# Altium schematic symbol library IC.SchLib: 555 symbols (part 15 of 15)
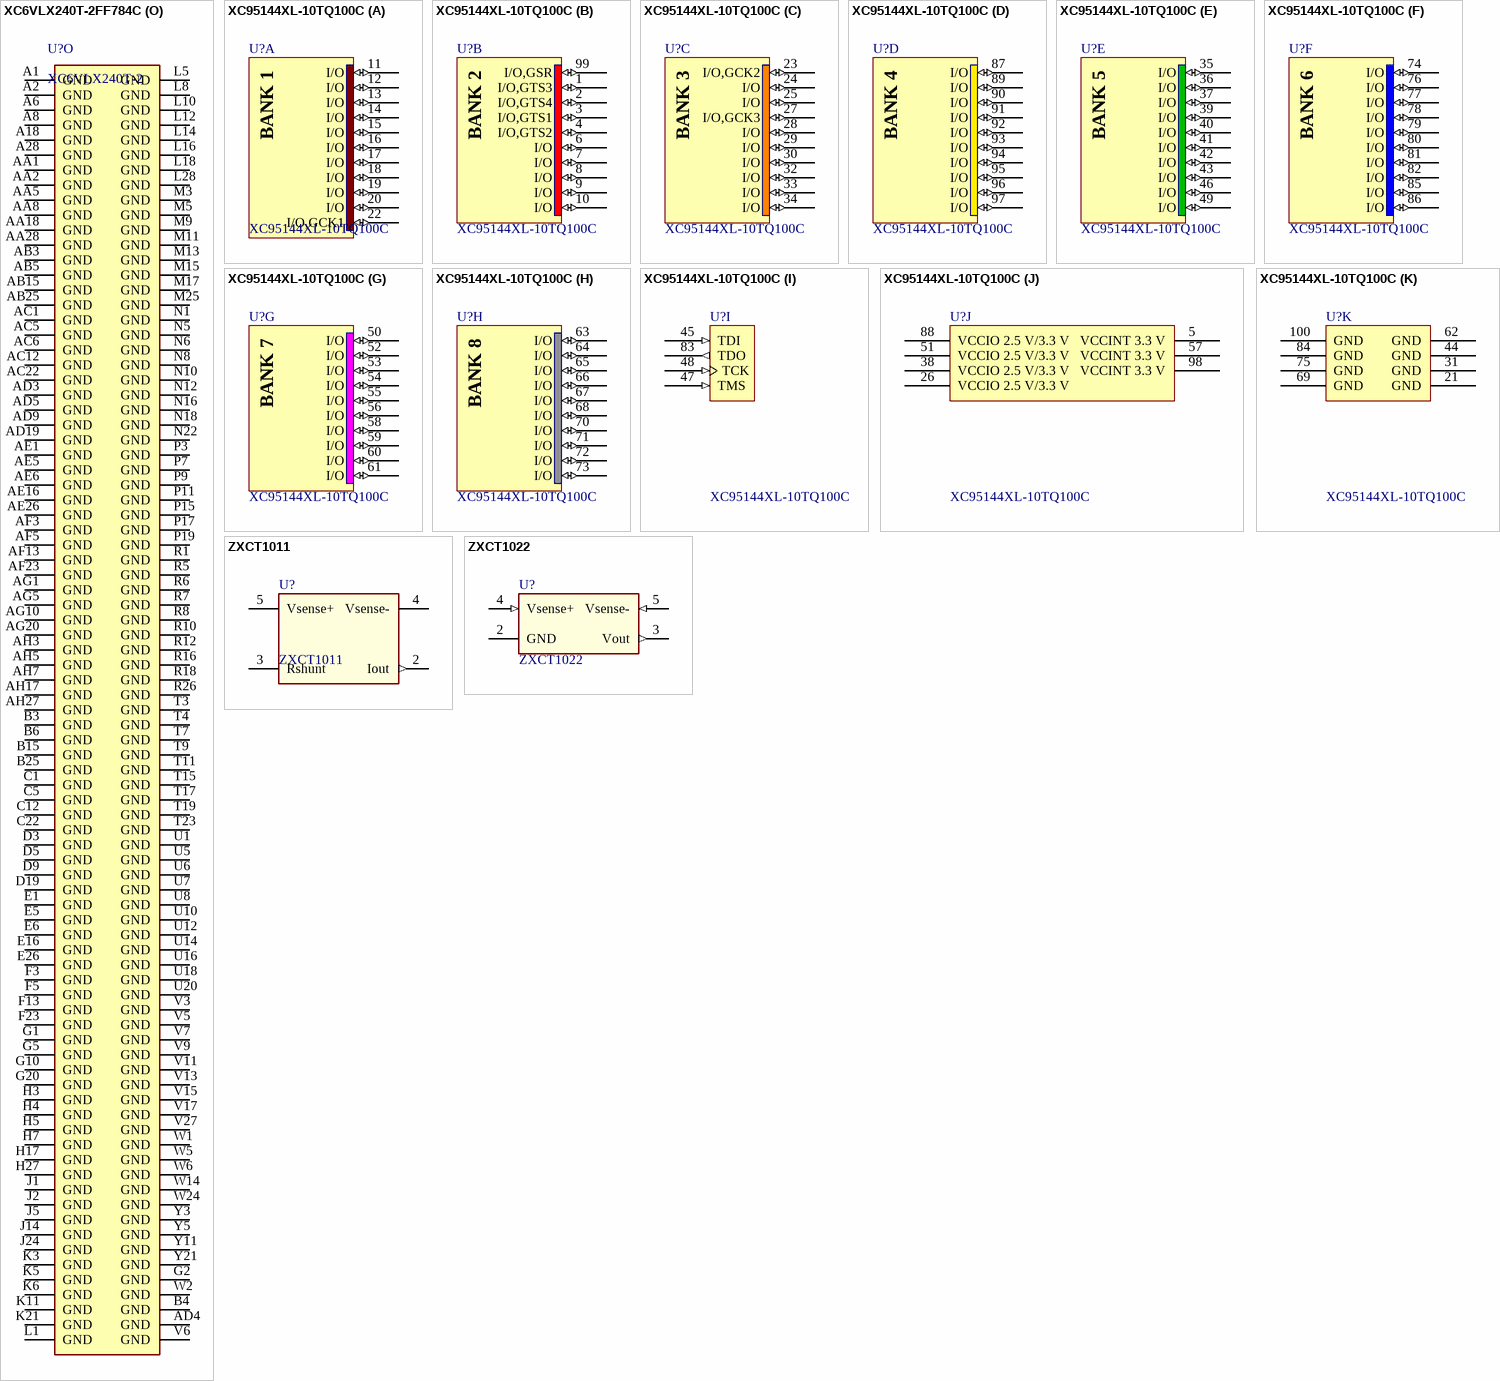
[diagram p84: symbols XC6VLX240T-2FF784C to ZXCT1022]

## XC6VLX240T-2FF784C
designator U?, comment XC6VLX240T-2
Xilinx Virtex-6 LXT Platform FPGA, 784-Ball FFBGA, Speed Grade 2, 400 User I/Os, 12 GTXs, Commercial Grade, Pb-Free; Manufacturer No: XC6VLX240T-2FF784C; Sort: 510; Tech: SMDR; Manufacturer: Xilinx; Package: FFG784; Price: 0
footprint FF784 (BGA, 784-Leads, Body 29x29mm, Pitch 1mm)
signal-integrity model XC6VLX75T_FF784 (Virtex-6)
part A pins: P20 IO_L14N_VREF_14 (io), P21 IO_L8P_SRCC_14 (io), P22 IO_L8N_SRCC_14 (io), R20 IO_L14P_14 (io), R21 VCCO_14 (power), R22 IO_L18P_14 (io), R23 IO_L18N_14 (io), R24 IO_L12P_VRN_14 (io), R25 IO_L12N_VRP_14 (io), R27 IO_L0P_14 (io), R28 IO_L0N_14 (io), T21 IO_L19P_14 (io), T22 IO_L19N_14 (io), T24 IO_L15P_14 (io), T25 IO_L15N_14 (io), T26 IO_L10N_MRCC_14 (io), T27 IO_L1P_14 (io), T28 VCCO_14 (power), U21 IO_L17N_14 (io), U22 IO_L17P_14 (io), U23 IO_L11N_SRCC_14 (io), U24 IO_L16N_14 (io), U25 VCCO_14 (power), U26 IO_L10P_MRCC_14 (io), U27 IO_L1N_14 (io), U28 IO_L2N_14 (io), V22 VCCO_14 (power), V23 IO_L11P_SRCC_14 (io), V24 IO_L16P_14 (io), V25 IO_L3N_14 (io), V26 IO_L4N_VREF_14 (io), V28 IO_L2P_14 (io), W22 IO_L13N_14 (io), W23 IO_L9N_MRCC_14 (io), W25 IO_L3P_14 (io), W26 IO_L4P_14 (io), W27 IO_L6P_14 (io), W28 IO_L5N_14 (io), Y22 IO_L13P_14 (io), Y23 IO_L9P_MRCC_14 (io), Y24 IO_L7N_14 (io), Y25 IO_L7P_14 (io), Y26 VCCO_14 (power), Y27 IO_L6N_14 (io), Y28 IO_L5P_14 (io)
part B pins: H25 IO_L1P_15 (io), H26 IO_L1N_15 (io), J23 IO_L2N_SM8N_15 (io), J25 IO_L5N_SM10N_15 (io), J26 IO_L3P_SM9P_15 (io), J27 IO_L3N_SM9N_15 (io), J28 IO_L7P_SM12P_15 (io), K22 IO_L0P_15 (io), K23 IO_L0N_15 (io), K24 IO_L2P_SM8P_15 (io), K25 IO_L5P_SM10P_15 (io), K26 VCCO_15 (power), K27 IO_L9P_MRCC_15 (io), K28 IO_L7N_SM12N_15 (io), L20 IO_L4P_15 (io), L21 IO_L8P_SRCC_15 (io), L22 IO_L8N_SRCC_15 (io), L23 VCCO_15 (power), L24 IO_L14P_15 (io), L25 IO_L14N_VREF_15 (io), L26 IO_L9N_MRCC_15 (io), L27 IO_L12N_SM13N_15 (io), M19 IO_L4N_VREF_15 (io), M20 VCCO_15 (power), M21 IO_L10N_MRCC_15 (io), M22 IO_L10P_MRCC_15 (io), M23 IO_L6P_SM11P_15 (io), M24 IO_L6N_SM11N_15 (io), M26 IO_L11P_SRCC_15 (io), M27 IO_L12P_SM13P_15 (io), M28 IO_L15N_SM15N_15 (io), N20 IO_L18P_15 (io), N21 IO_L18N_15 (io), N23 IO_L19P_15 (io), N24 IO_L16P_VRN_15 (io), N25 IO_L16N_VRP_15 (io), N26 IO_L11N_SRCC_15 (io), N27 VCCO_15 (power), N28 IO_L15P_SM15P_15 (io), P23 IO_L19N_15 (io), P24 VCCO_15 (power), P25 IO_L17N_15 (io), P26 IO_L17P_15 (io), P27 IO_L13N_SM14N_15 (io), P28 IO_L13P_SM14P_15 (io)
part C pins: A26 IO_L7P_16 (io), A27 IO_L7N_16 (io), B24 IO_L1P_16 (io), B26 IO_L3P_16 (io), B27 IO_L9P_MRCC_16 (io), B28 IO_L9N_MRCC_16 (io), C23 IO_L4N_VREF_16 (io), C24 IO_L1N_16 (io), C25 IO_L3N_16 (io), C26 IO_L18N_16 (io), C27 VCCO_16 (power), C28 IO_L11N_SRCC_16 (io), D22 IO_L4P_16 (io), D23 IO_L14N_VREF_16 (io), D24 VCCO_16 (power), D25 IO_L6N_16 (io), D26 IO_L18P_16 (io), D27 IO_L11P_SRCC_16 (io), D28 IO_L13P_16 (io), E22 IO_L5P_16 (io), E23 IO_L14P_16 (io), E24 IO_L6P_16 (io), E25 IO_L10P_MRCC_16 (io), E27 IO_L16N_16 (io), E28 IO_L13N_16 (io), F22 IO_L5N_16 (io), F24 IO_L10N_MRCC_16 (io), F25 IO_L15N_16 (io), F26 IO_L15P_16 (io), F27 IO_L16P_16 (io), F28 VCCO_16 (power), G22 IO_L0P_16 (io), G23 IO_L2N_16 (io), G24 IO_L12N_VRP_16 (io), G25 VCCO_16 (power), G26 IO_L17N_16 (io), G27 IO_L17P_16 (io), G28 IO_L19P_16 (io), H21 IO_L0N_16 (io), H22 VCCO_16 (power), H23 IO_L2P_16 (io), H24 IO_L12P_VRN_16 (io), H28 IO_L19N_16 (io), J21 IO_L8P_SRCC_16 (io), J22 IO_L8N_SRCC_16 (io)
part D pins: AA19 IO_L12P_VRN_23 (io), AA20 IO_L11N_SRCC_23 (io), AA21 IO_L5P_23 (io), AB18 IO_L16P_23 (io), AB19 IO_L15N_23 (io), AB20 VCCO_23 (power), AB21 IO_L5N_23 (io), AC18 IO_L16N_23 (io), AC19 IO_L15P_23 (io), AC20 IO_L9N_MRCC_23 (io), AC21 IO_L1N_23 (io), AD18 IO_L14P_23 (io), AD20 IO_L8P_SRCC_23 (io), AD21 IO_L9P_MRCC_23 (io), AD22 IO_L1P_23 (io), AE18 IO_L14N_VREF_23 (io), AE19 IO_L10N_MRCC_23 (io), AE20 IO_L8N_SRCC_23 (io), AE21 VCCO_23 (power), AE22 IO_L4N_VREF_23 (io), AF17 IO_L13N_23 (io), AF18 VCCO_23 (power), AF19 IO_L10P_MRCC_23 (io), AF20 IO_L7N_23 (io), AF21 IO_L3N_23 (io), AF22 IO_L4P_23 (io), AG17 IO_L13P_23 (io), AG18 IO_L18P_23 (io), AG19 IO_L19N_23 (io), AG21 IO_L7P_23 (io), AG22 IO_L3P_23 (io), AH18 IO_L18N_23 (io), AH19 IO_L19P_23 (io), AH20 IO_L17P_23 (io), AH21 IO_L17N_23 (io), AH22 VCCO_23 (power), V19 IO_L2N_23 (io), V20 IO_L2P_23 (io), V21 IO_L0N_23 (io), W18 IO_L6N_23 (io), W19 VCCO_23 (power), W21 IO_L0P_23 (io), Y18 IO_L6P_23 (io), Y19 IO_L12N_VRP_23 (io), Y20 IO_L11P_SRCC_23 (io)
part E pins: AA22 IO_L19N_24 (io), AA23 VCCO_24 (power), AA24 IO_L6P_D7_24 (io), AA25 IO_L6N_D6_24 (io), AA26 IO_L0P_GC_24 (io), AA27 IO_L0N_GC_24 (io), AB22 IO_L19P_24 (io), AB23 IO_L11P_SRCC_24 (io), AB24 IO_L16N_CSO_B_24 (io), AB26 IO_L8N_SRCC_24 (io), AB27 IO_L8P_SRCC_24 (io), AB28 IO_L2N_D14_24 (io), AC23 IO_L11N_SRCC_24 (io), AC24 IO_L16P_RS0_24 (io), AC25 IO_L7P_D5_24 (io), AC26 IO_L12P_D3_24 (io), AC27 VCCO_24 (power), AC28 IO_L2P_D15_24 (io), AD23 IO_L18N_24 (io), AD24 VCCO_24 (power), AD25 IO_L7N_D4_24 (io), AD26 IO_L12N_D2_FS2_24 (io), AD27 IO_L1N_GC_24 (io), AD28 IO_L1P_GC_24 (io), AE23 IO_L18P_24 (io), AE24 IO_L14P_FCS_B_24 (io), AE25 IO_L10P_MRCC_24 (io), AE27 IO_L5N_D8_24 (io), AE28 IO_L5P_D9_24 (io), AF24 IO_L14N_VREF_FOE_B_MOSI_24 (io), AF25 IO_L10N_MRCC_24 (io), AF26 IO_L9P_MRCC_24 (io), AF27 IO_L3N_D12_24 (io), AF28 VCCO_24 (power), AG23 IO_L17N_VRP_24 (io), AG24 IO_L15P_FWE_B_24 (io), AG25 VCCO_24 (power), AG26 IO_L9N_MRCC_24 (io), AG27 IO_L4P_D11_24 (io), AG28 IO_L3P_D13_24 (io), AH23 IO_L17P_VRN_24 (io), AH24 IO_L15N_RS1_24 (io), AH25 IO_L13N_D0_FS0_24 (io), AH26 IO_L13P_D1_FS1_24 (io), AH28 IO_L4N_VREF_D10_24 (io)
part F pins: A19 IO_L8N_SRCC_25 (io), A20 IO_L8P_SRCC_25 (io), A21 IO_L11P_SRCC_25 (io), A22 IO_L11N_SRCC_25 (io), A23 VCCO_25 (power), A24 IO_L15P_25 (io), A25 IO_L15N_25 (io), B18 IO_L5P_25 (io), B19 IO_L5N_25 (io), B20 VCCO_25 (power), B21 IO_L13P_25 (io), B22 IO_L17P_25 (io), B23 IO_L17N_25 (io), C18 IO_L3P_25 (io), C19 IO_L12P_25 (io), C20 IO_L12N_25 (io), C21 IO_L13N_25 (io), D17 IO_L6P_25 (io), D18 IO_L3N_25 (io), D20 IO_L10P_MRCC_25 (io), D21 IO_L16N_VRP_25 (io), E17 IO_L6N_25 (io), E18 IO_L7P_25 (io), E19 IO_L10N_MRCC_25 (io), E20 IO_L16P_VRN_25 (io), E21 VCCO_25 (power), F17 IO_L1N_25 (io), F18 VCCO_25 (power), F19 IO_L7N_25 (io), F20 IO_L19P_GC_25 (io), F21 IO_L19N_GC_25 (io), G17 IO_L1P_25 (io), G18 IO_L4P_25 (io), G19 IO_L9N_MRCC_25 (io), G21 IO_L18N_GC_25 (io), H18 IO_L4N_VREF_25 (io), H19 IO_L9P_MRCC_25 (io), H20 IO_L18P_GC_25 (io), J17 IO_L2P_25 (io), J18 IO_L2N_25 (io), J19 VCCO_25 (power), J20 IO_L14N_VREF_25 (io), K17 IO_L0P_25 (io), K18 IO_L0N_25 (io), K19 IO_L14P_25 (io)
part G pins: A11 IO_L14P_26 (io), A12 IO_L14N_VREF_26 (io), A13 VCCO_26 (power), A14 IO_L9N_MRCC_26 (io), A15 IO_L13P_26 (io), A16 IO_L13N_26 (io), A17 IO_L17P_26 (io), B11 IO_L5P_26 (io), B12 IO_L18P_26 (io), B13 IO_L7N_26 (io), B14 IO_L9P_MRCC_26 (io), B16 IO_L15N_26 (io), B17 IO_L17N_26 (io), C11 IO_L5N_26 (io), C13 IO_L18N_26 (io), C14 IO_L7P_26 (io), C15 IO_L15P_26 (io), C16 IO_L16N_26 (io), C17 VCCO_26 (power), D11 IO_L0N_26 (io), D12 IO_L6N_26 (io), D13 IO_L6P_26 (io), D14 VCCO_26 (power), D15 IO_L12N_VRP_26 (io), D16 IO_L16P_26 (io), E11 VCCO_26 (power), E12 IO_L0P_26 (io), E13 IO_L1P_26 (io), E14 IO_L1N_26 (io), E15 IO_L12P_VRN_26 (io), F12 IO_L11N_SRCC_26 (io), F14 IO_L3N_26 (io), F15 IO_L10N_MRCC_26 (io), F16 IO_L10P_MRCC_26 (io), G12 IO_L11P_SRCC_26 (io), G13 IO_L19N_26 (io), G14 IO_L3P_26 (io), G15 VCCO_26 (power), G16 IO_L2N_26 (io), H14 IO_L19P_26 (io), H15 IO_L4N_VREF_26 (io), H16 IO_L2P_26 (io), J15 IO_L8P_SRCC_26 (io), J16 IO_L4P_26 (io), K15 IO_L8N_SRCC_26 (io)
part H pins: AA12 IO_L8N_SRCC_34 (io), AA13 VCCO_34 (power), AA14 IO_L3N_A12_D28_34 (io), AA15 IO_L16P_A21_34 (io), AA16 IO_L17P_A19_34 (io), AA17 IO_L19N_VRP_34 (io), AB12 IO_L1P_GC_34 (io), AB13 IO_L3P_A13_D29_34 (io), AB14 IO_L5P_A09_D25_34 (io), AB16 IO_L14P_A25_34 (io), AB17 IO_L17N_A18_34 (io), AC13 IO_L1N_GC_34 (io), AC14 IO_L5N_A08_D24_34 (io), AC15 IO_L11N_SRCC_34 (io), AC16 IO_L14N_VREF_A24_34 (io), AC17 VCCO_34 (power), AD12 IO_L0N_GC_34 (io), AD13 IO_L6P_A07_D23_34 (io), AD14 VCCO_34 (power), AD15 IO_L11P_SRCC_34 (io), AD16 IO_L15P_A23_34 (io), AD17 IO_L12N_A02_D18_34 (io), AE13 IO_L0P_GC_34 (io), AE14 IO_L6N_A06_D22_34 (io), AE15 IO_L15N_A22_34 (io), AE17 IO_L12P_A03_D19_34 (io), AF14 IO_L4P_A11_D27_34 (io), AF15 IO_L10N_MRCC_34 (io), AF16 IO_L13P_A01_D17_34 (io), AG13 IO_L4N_VREF_A10_D26_34 (io), AG14 IO_L10P_MRCC_34 (io), AG15 VCCO_34 (power), AG16 IO_L13N_A00_D16_34 (io), AH13 IO_L7P_A05_D21_34 (io), AH14 IO_L7N_A04_D20_34 (io), AH15 IO_L9P_MRCC_34 (io), AH16 IO_L9N_MRCC_34 (io), W12 IO_L2P_A15_D31_34 (io), W16 IO_L18P_A17_34 (io), Y12 IO_L2N_A14_D30_34 (io), Y13 IO_L8P_SRCC_34 (io), Y14 IO_L16N_A20_34 (io), Y15 IO_L18N_A16_34 (io), Y16 VCCO_34 (power), Y17 IO_L19P_VRN_34 (io)
part I pins: AA7 IO_L2P_SM0P_35 (io), AA9 IO_L4P_35 (io), AA10 IO_L1N_35 (io), AA11 IO_L9N_MRCC_35 (io), AB7 IO_L2N_SM0N_35 (io), AB8 IO_L6N_SM3N_35 (io), AB9 IO_L4N_VREF_35 (io), AB10 VCCO_35 (power), AB11 IO_L9P_MRCC_35 (io), AC7 VCCO_35 (power), AC8 IO_L6P_SM3P_35 (io), AC9 IO_L3P_SM1P_35 (io), AC10 IO_L5P_SM2P_35 (io), AC11 IO_L7N_SM4N_35 (io), AD7 IO_L10P_MRCC_35 (io), AD8 IO_L3N_SM1N_35 (io), AD10 IO_L5N_SM2N_35 (io), AD11 IO_L7P_SM4P_35 (io), AE7 IO_L10N_MRCC_35 (io), AE8 IO_L12N_SM5N_35 (io), AE9 IO_L14P_35 (io), AE10 IO_L18N_GC_35 (io), AE11 VCCO_35 (power), AE12 IO_L15N_SM7N_35 (io), AF7 IO_L12P_SM5P_35 (io), AF8 VCCO_35 (power), AF9 IO_L14N_VREF_35 (io), AF10 IO_L18P_GC_35 (io), AF11 IO_L11P_SRCC_35 (io), AF12 IO_L15P_SM7P_35 (io), AG7 IO_L16P_VRN_35 (io), AG8 IO_L16N_VRP_35 (io), AG9 IO_L13P_SM6P_35 (io), AG11 IO_L11N_SRCC_35 (io), AG12 IO_L19N_GC_35 (io), AH8 IO_L13N_SM6N_35 (io), AH9 IO_L17P_35 (io), AH10 IO_L17N_35 (io), AH11 IO_L19P_GC_35 (io), AH12 VCCO_35 (power), W8 IO_L0P_35 (io), W9 VCCO_35 (power), W10 IO_L8N_SRCC_35 (io), W11 IO_L8P_SRCC_35 (io), Y9 IO_L0N_35 (io), Y10 IO_L1P_35 (io)
part J pins: A7 IO_L3P_36 (io), A9 IO_L2N_36 (io), A10 IO_L2P_36 (io), B7 IO_L3N_36 (io), B8 IO_L1P_36 (io), B9 IO_L12P_VRN_36 (io), B10 VCCO_36 (power), C7 VCCO_36 (power), C8 IO_L1N_36 (io), C9 IO_L12N_VRP_36 (io), C10 IO_L8N_SRCC_36 (io), D7 IO_L14P_36 (io), D8 IO_L5P_36 (io), D10 IO_L8P_SRCC_36 (io), E7 IO_L14N_VREF_36 (io), E8 IO_L7P_36 (io), E9 IO_L5N_36 (io), E10 IO_L0N_36 (io), F7 IO_L9P_MRCC_36 (io), F8 VCCO_36 (power), F9 IO_L7N_36 (io), F10 IO_L6N_36 (io), F11 IO_L0P_36 (io), G7 IO_L9N_MRCC_36 (io), G8 IO_L13P_36 (io), G9 IO_L13N_36 (io), G11 IO_L6P_36 (io), H8 IO_L15P_36 (io), H9 IO_L15N_36 (io), H10 IO_L10N_MRCC_36 (io), H11 IO_L10P_MRCC_36 (io), H12 VCCO_36 (power), H13 IO_L4P_36 (io), J7 IO_L17P_36 (io), J8 IO_L17N_36 (io), J9 VCCO_36 (power), J10 IO_L16N_36 (io), J11 IO_L16P_36 (io), J12 IO_L11P_SRCC_36 (io), J13 IO_L4N_VREF_36 (io), K7 IO_L19P_36 (io), K9 IO_L18P_36 (io), K10 IO_L18N_36 (io), K13 IO_L11N_SRCC_36 (io), L7 IO_L19N_36 (io)
part K pins: AA6 TDI_0 (in), AB6 TCK_0 (in), AF6 DOUT_BUSY_0 (out), AG6 CSI_B_0 (in), AH6 CCLK_0 (io), C6 M2_0 (in), D6 M1_0 (in), F6 M0_0 (in), G6 RDWR_B_0 (in), H6 DIN_0 (in), L6 DONE_0 (io), M6 INIT_B_0 (io), M7 PROGRAM_B_0 (in), N7 HSWAPEN_0 (in), T13 DXN_0, T14 DXP_0, W7 VCCO_0 (power), Y6 TMS_0 (in), Y7 TDO_0 (out), Y8 VCCO_0 (power)
part L pins: A3 MGTRXP3_116 (in), A4 MGTRXN3_116 (in), A5 MGTAVTTRCAL_115, AA3 MGTREFCLK0N_114 (in), AA4 MGTREFCLK0P_114 (in), AB1 MGTTXP2_114 (out), AB2 MGTTXN2_114 (out), AC3 MGTRXP3_114 (in), AC4 MGTRXN3_114 (in), AD1 MGTTXP1_114 (out), AD2 MGTTXN1_114 (out), AE3 MGTRXP2_114 (in), AE4 MGTRXN2_114 (in), AF1 MGTTXP0_114 (out), AF2 MGTTXN0_114 (out), AG3 MGTRXP1_114 (in), AG4 MGTRXN1_114 (in), AH1 MGTRXP0_114 (in), AH2 MGTRXN0_114 (in), B1 MGTRXP2_116 (in), B2 MGTRXN2_116 (in), B5 MGTRREF_115, C3 MGTRXP1_116 (in), C4 MGTRXN1_116 (in), D1 MGTTXP3_116 (out), D2 MGTTXN3_116 (out), E3 MGTRXP0_116 (in), E4 MGTRXN0_116 (in), F1 MGTTXP2_116 (out), F2 MGTTXN2_116 (out), G3 MGTREFCLK1N_116 (in), G4 MGTREFCLK1P_116 (in), H1 MGTTXP1_116 (out), H2 MGTTXN1_116 (out), J3 MGTREFCLK0N_116 (in), J4 MGTREFCLK0P_116 (in), K1 MGTTXP0_116 (out), K2 MGTTXN0_116 (out), L3 MGTRXP3_115 (in), L4 MGTRXN3_115 (in), M1 MGTTXP3_115 (out), M2 MGTTXN3_115 (out), N3 MGTRXP2_115 (in), N4 MGTRXN2_115 (in), P1 MGTTXP2_115 (out), P2 MGTTXN2_115 (out), P5 MGTREFCLK1N_115 (in), P6 MGTREFCLK1P_115 (in), R3 MGTRXP1_115 (in), R4 MGTRXN1_115 (in), T1 MGTTXP1_115 (out), T2 MGTTXN1_115 (out), T5 MGTREFCLK0N_115 (in), T6 MGTREFCLK0P_115 (in), U3 MGTRXP0_115 (in), U4 MGTRXN0_115 (in), V1 MGTTXP0_115 (out), V2 MGTTXN0_115 (out), W3 MGTREFCLK1N_114 (in), W4 MGTREFCLK1P_114 (in), Y1 MGTTXP3_114 (out), Y2 MGTTXN3_114 (out)
part M pins: AD6 VFS_0 (power), J6 VBATT_0 (power), N13 AVSS_0 (power), N14 AVDD_0 (power), P13 VREFN_0 (power), P14 VP_0 (power), R13 VN_0 (power), R14 VREFP_0 (power)
part N pins: AB4 MGTAVCC (power), AC2 MGTAVTT (power), AE2 MGTAVTT (power), AF4 MGTAVCC (power), AG2 MGTAVTT (power), AH4 MGTAVCC (power), C2 MGTAVTT (power), D4 MGTAVCC (power), E2 MGTAVTT (power), F4 MGTAVCC (power), K4 MGTAVCC (power), K8 VCCAUX (power), K12 VCCINT (power), K14 VCCINT (power), K16 VCCINT (power), K20 VCCAUX (power), L2 MGTAVTT (power), L9 VCCINT (power), L11 VCCINT (power), L13 VCCINT (power), L15 VCCINT (power), L17 VCCINT (power), L19 VCCAUX (power), M4 MGTAVCC (power), M8 VCCAUX (power), M10 VCCINT (power), M12 VCCINT (power), M14 VCCINT (power), M16 VCCINT (power), M18 VCCINT (power), N2 MGTAVTT (power), N9 VCCINT (power), N11 VCCINT (power), N15 VCCINT (power), N17 VCCINT (power), N19 VCCAUX (power), P4 MGTAVCC (power), P8 VCCAUX (power), P10 VCCINT (power), P12 VCCINT (power), P16 VCCINT (power), P18 VCCINT (power), R2 MGTAVTT (power), R9 VCCINT (power), R11 VCCINT (power), R15 VCCINT (power), R17 VCCINT (power), R19 VCCAUX (power), T8 VCCAUX (power), T10 VCCINT (power), T12 VCCINT (power), T16 VCCINT (power), T18 VCCINT (power), T20 VCCAUX (power), U2 MGTAVTT (power), U9 VCCAUX (power), U11 VCCINT (power), U13 VCCINT (power), U15 VCCINT (power), U17 VCCINT (power), U19 VCCAUX (power), V4 MGTAVCC (power), V8 VCCAUX (power), V10 VCCINT (power), V12 VCCINT (power), V14 VCCINT (power), V16 VCCINT (power), V18 VCCINT (power), W13 VCCINT (power), W15 VCCINT (power), W17 VCCINT (power), W20 VCCAUX (power), Y4 MGTAVCC (power)
part O pins: A1 GND (power), A2 GND (power), A6 GND (power), A8 GND (power), A18 GND (power), A28 GND (power), AA1 GND (power), AA2 GND (power), AA5 GND (power), AA8 GND (power), AA18 GND (power), AA28 GND (power), AB3 GND (power), AB5 GND (power), AB15 GND (power), AB25 GND (power), AC1 GND (power), AC5 GND (power), AC6 GND (power), AC12 GND (power), AC22 GND (power), AD3 GND (power), AD4 GND (power), AD5 GND (power), AD9 GND (power), AD19 GND (power), AE1 GND (power), AE5 GND (power), AE6 GND (power), AE16 GND (power), AE26 GND (power), AF3 GND (power), AF5 GND (power), AF13 GND (power), AF23 GND (power), AG1 GND (power), AG5 GND (power), AG10 GND (power), AG20 GND (power), AH3 GND (power), AH5 GND (power), AH7 GND (power), AH17 GND (power), AH27 GND (power), B3 GND (power), B4 GND (power), B6 GND (power), B15 GND (power), B25 GND (power), C1 GND (power), C5 GND (power), C12 GND (power), C22 GND (power), D3 GND (power), D5 GND (power), D9 GND (power), D19 GND (power), E1 GND (power), E5 GND (power), E6 GND (power), E16 GND (power), E26 GND (power), F3 GND (power), F5 GND (power), F13 GND (power), F23 GND (power), G1 GND (power), G2 GND (power), G5 GND (power), G10 GND (power), G20 GND (power), H3 GND (power), H4 GND (power), H5 GND (power), H7 GND (power), H17 GND (power), H27 GND (power), J1 GND (power), J2 GND (power), J5 GND (power), J14 GND (power), J24 GND (power), K3 GND (power), K5 GND (power), K6 GND (power), K11 GND (power), K21 GND (power), L1 GND (power), L5 GND (power), L8 GND (power), L10 GND (power), L12 GND (power), L14 GND (power), L16 GND (power), L18 GND (power), L28 GND (power), M3 GND (power), M5 GND (power), M9 GND (power), M11 GND (power), M13 GND (power), M15 GND (power), M17 GND (power), M25 GND (power), N1 GND (power), N5 GND (power), N6 GND (power), N8 GND (power), N10 GND (power), N12 GND (power), N16 GND (power), N18 GND (power), N22 GND (power), P3 GND (power), P7 GND (power), P9 GND (power), P11 GND (power), P15 GND (power), P17 GND (power), P19 GND (power), R1 GND (power), R5 GND (power), R6 GND (power), R7 GND (power), R8 GND (power), R10 GND (power), R12 GND (power), R16 GND (power), R18 GND (power), R26 GND (power), T3 GND (power), T4 GND (power), T7 GND (power), T9 GND (power), T11 GND (power), T15 GND (power), T17 GND (power), T19 GND (power), T23 GND (power), U1 GND (power), U5 GND (power), U6 GND (power), U7 GND (power), U8 GND (power), U10 GND (power), U12 GND (power), U14 GND (power), U16 GND (power), U18 GND (power), U20 GND (power), V3 GND (power), V5 GND (power), V6 GND (power), V7 GND (power), V9 GND (power), V11 GND (power), V13 GND (power), V15 GND (power), V17 GND (power), V27 GND (power), W1 GND (power), W2 GND (power), W5 GND (power), W6 GND (power), W14 GND (power), W24 GND (power), Y3 GND (power), Y5 GND (power), Y11 GND (power), Y21 GND (power)
part A text: BANK 14
part B text: BANK 15
part C text: BANK 16
part D text: BANK 23
part E text: BANK 24
part F text: BANK 25
part G text: BANK 26
part H text: BANK 34
part I text: BANK 35
part J text: BANK 36

## XC95144XL-10TQ100C
designator U?
FastFLASH XC900XL, 3.3V High-Performance CPLD with 144 Macrocells, 100-Pin TQFP, Commercial Grade; Sort: 510; Tech: SMDR; Package: TQ100; Price: 0
footprint TQ100_N (Thin QFP 100, 14x14mm, R0.5mm, IPC Medium Density)
footprint TQ100_L (Thin QFP, 100-Leads, Body 14x14mm, Pitch 0.5mm, IPC High Density)
footprint TQ100_M (Thin QFP, 100-Leads, Body 14x14mm, Pitch 0.5mm, IPC Low Density)
3D model XC95144XL-TQ100 (PCB3D Model)
signal-integrity model XC95144XL_TQ100 (XC9500XL)
part A pins: 11 I/O (io), 12 I/O (io), 13 I/O (io), 14 I/O (io), 15 I/O (io), 16 I/O (io), 17 I/O (io), 18 I/O (io), 19 I/O (io), 20 I/O (io), 22 I/O,GCK1 (io)
part B pins: 1 I/O,GTS3 (io), 2 I/O,GTS4 (io), 3 I/O,GTS1 (io), 4 I/O,GTS2 (io), 6 I/O (io), 7 I/O (io), 8 I/O (io), 9 I/O (io), 10 I/O (io), 99 I/O,GSR (io)
part C pins: 23 I/O,GCK2 (io), 24 I/O (io), 25 I/O (io), 27 I/O,GCK3 (io), 28 I/O (io), 29 I/O (io), 30 I/O (io), 32 I/O (io), 33 I/O (io), 34 I/O (io)
part D pins: 87 I/O (io), 89 I/O (io), 90 I/O (io), 91 I/O (io), 92 I/O (io), 93 I/O (io), 94 I/O (io), 95 I/O (io), 96 I/O (io), 97 I/O (io)
part E pins: 35 I/O (io), 36 I/O (io), 37 I/O (io), 39 I/O (io), 40 I/O (io), 41 I/O (io), 42 I/O (io), 43 I/O (io), 46 I/O (io), 49 I/O (io)
part F pins: 74 I/O (io), 76 I/O (io), 77 I/O (io), 78 I/O (io), 79 I/O (io), 80 I/O (io), 81 I/O (io), 82 I/O (io), 85 I/O (io), 86 I/O (io)
part G pins: 50 I/O (io), 52 I/O (io), 53 I/O (io), 54 I/O (io), 55 I/O (io), 56 I/O (io), 58 I/O (io), 59 I/O (io), 60 I/O (io), 61 I/O (io)
part H pins: 63 I/O (io), 64 I/O (io), 65 I/O (io), 66 I/O (io), 67 I/O (io), 68 I/O (io), 70 I/O (io), 71 I/O (io), 72 I/O (io), 73 I/O (io)
part I pins: 45 TDI (in), 47 TMS (in), 48 TCK (in), 83 TDO (out)
part J pins: 5 VCCINT 3.3 V (power), 26 VCCIO 2.5 V/3.3 V (power), 38 VCCIO 2.5 V/3.3 V (power), 51 VCCIO 2.5 V/3.3 V (power), 57 VCCINT 3.3 V (power), 88 VCCIO 2.5 V/3.3 V (power), 98 VCCINT 3.3 V (power)
part K pins: 21 GND (power), 31 GND (power), 44 GND (power), 62 GND (power), 69 GND (power), 75 GND (power), 84 GND (power), 100 GND (power)
part A text: BANK 1
part B text: BANK 2
part C text: BANK 3
part D text: BANK 4
part E text: BANK 5
part F text: BANK 6
part G text: BANK 7
part H text: BANK 8

## ZXCT1011
designator U?
Low drift high-side current monitor; Manufacturer: Zetex; Manufacturer No: ZXCT1011E5TA; Comment2: 2.5Vmin; 20Vmax 1%; Sort: 510; Tech: SMDR; Package: SOT23-5; Price: 0
footprint SOT23-5
pins: 1 NC hidden, 2 Iout (out), 3 Rshunt, 4 Vsense- (power), 5 Vsense+ (power)

## ZXCT1022
designator U?
Low offset high-side current monitor; Manufacturer: Zetex; Manufacturer No: ZXCT1022E5TA; Comment2: 2.5Vmin; 20Vmax 1%; Sort: 510; Tech: SMDR; Package: SOT23-5; Price: 0
footprint SOT23-5
pins: 1 NC (power) hidden, 2 GND (power), 3 Vout (out), 4 Vsense+ (in), 5 Vsense- (in)